# Altium footprint library 3.22-杂项.PcbLib: 199 footprints (part 8 of 15)
Each footprint in its own frame and in the unit in brackets; x right, y up, seen from the top. Pads: shape width x height; smd on the part's side, far side on the other; paste and mask are expansions set on the pad; w line width, h text height; cw(c..) or ccw(c..) is an arc to the next point about the centre after c.
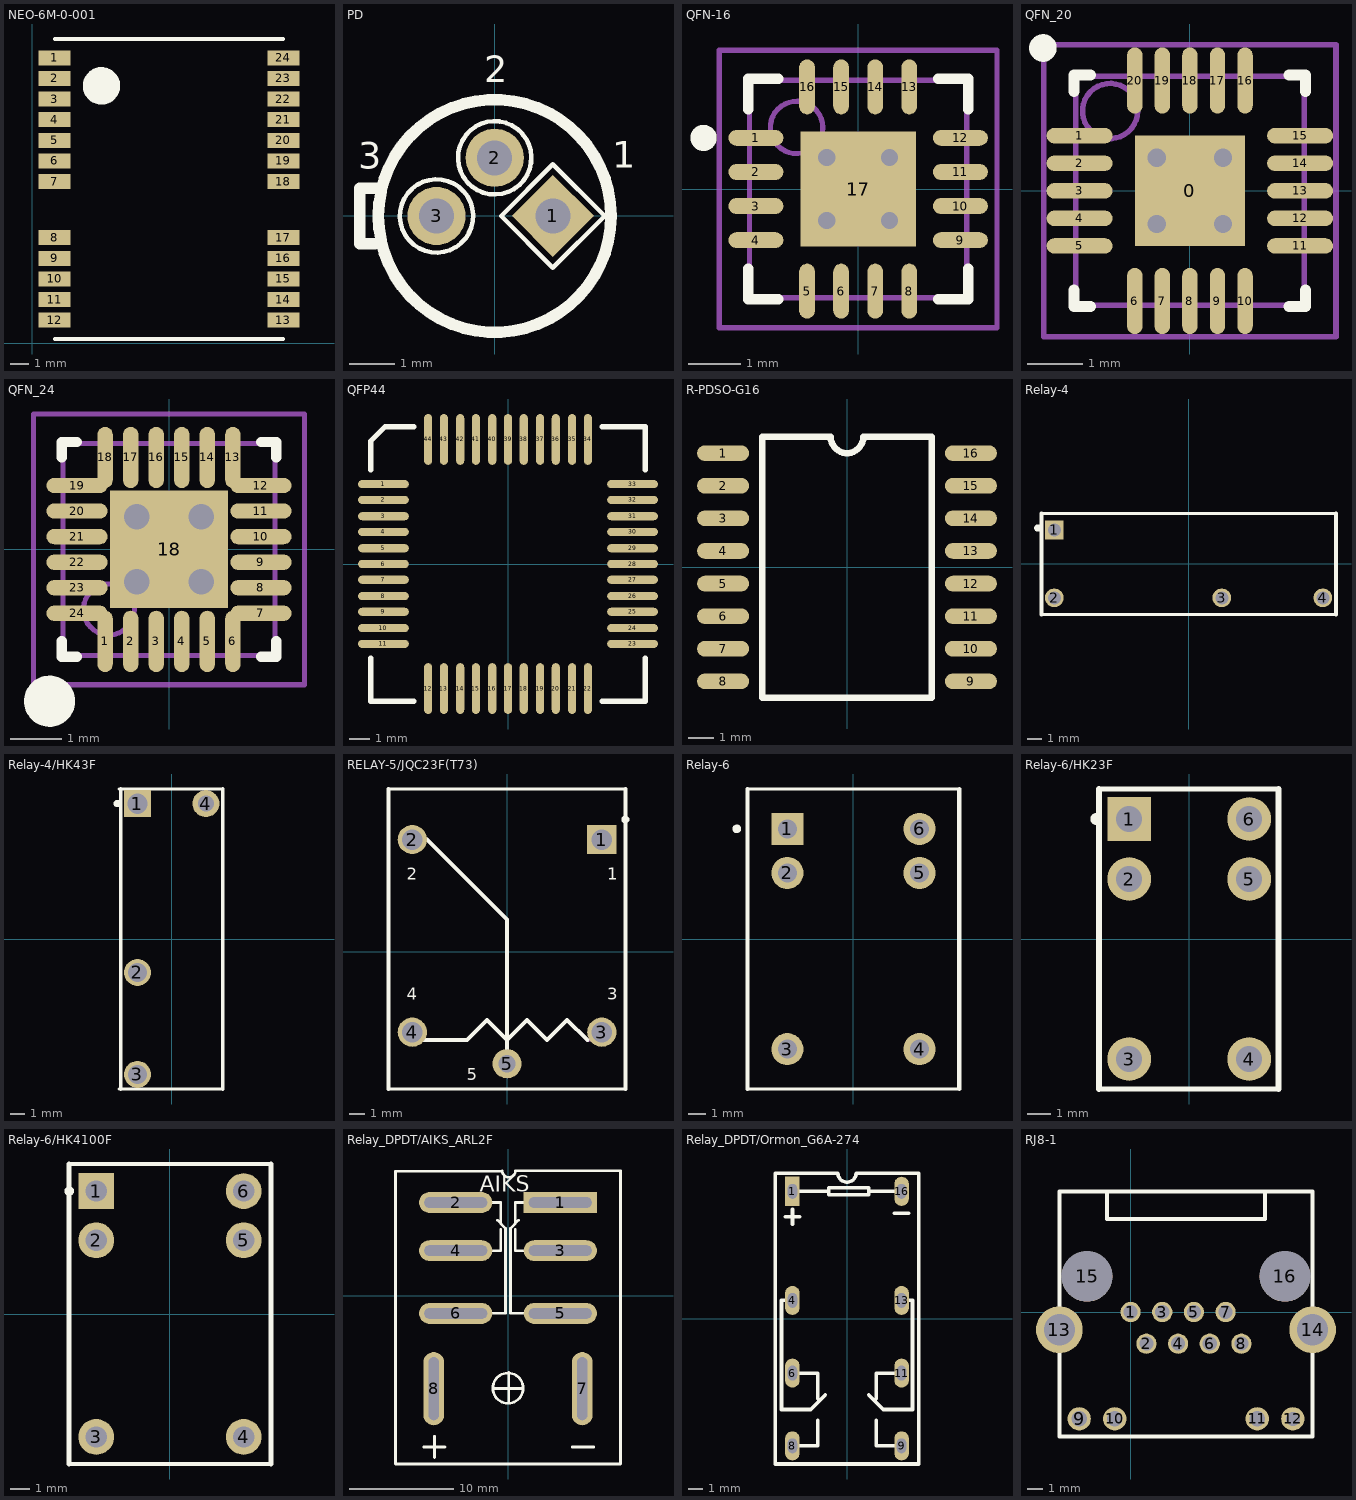
[diagram p7: the footprints below, top view; thin cyan lines are the x and y axes]

## NEO-6M-0-001 [mm] "[ PCBѧϰȺ514746572 ]"
pads (24):
  rect 1.7x0.8 smd: 1(1.199,15.223) 2(1.199,14.123) 3(1.199,13.023) 4(1.199,11.923) 5(1.199,10.823) 6(1.199,9.723) 7(1.199,8.623) 8(1.199,5.623) 9(1.199,4.523) 10(1.199,3.423) 11(1.199,2.323) 12(1.199,1.223) 13(13.399,1.223) 14(13.399,2.323) 15(13.399,3.423) 16(13.399,4.523) 17(13.399,5.623) 18(13.399,8.623) 19(13.399,9.723) 20(13.399,10.823) 21(13.399,11.923) 22(13.399,13.023) 23(13.399,14.123) 24(13.399,15.223)
Top Overlay:
  circle w1: c3.699,13.723 r0.5
  lines w0.2: 1.199,0.223 13.399,0.223 ; 1.199,16.223 13.399,16.223
3D body: height 0.82, standoff 0.01, extent 1.199,0.223 13.399,16.223
3D body: height 2.4, standoff 0.82, extent 2.199,1.223 12.399,15.223

## PD [mil] "[ PCBѧϰȺ514746572 ]"
pads (3):
  rect 50x50 hole 30 rot 45: 1(50,0)
  round 50 hole 30: 2(0,50) 3(-50,0)
Top Overlay:
  circle w10: c0,0 r100
  lines w3.94: -18.5,1 ccw(c-50,0) -18.5,0.98 ; 5.5,0 50,44.5 94.5,0 50,-44.5 5.5,0 ; 31.5,51 ccw(c0,50) 31.5,50.98
  lines w9.84: -103,-24 -116,-24 -116,24 -102,24
  text "1" at 101,33.5 h39.37
  text "2" at -9,107 h39.37
  text "3" at -117.5,33 h39.37
Bottom Overlay:
  lines w3.94: -18.5,1 ccw(c-50,0) -18.5,0.98 ; 5.5,0 50,-44.5 94.5,0 50,44.5 5.5,0 ; 31.5,51 ccw(c0,50) 31.5,50.98

## QFN-16 [mm] "QFN      [ PCBѧϰȺ514746572 ]"
height 0.8
pads (17):
  oval 1.05x0.3 smd: 1(-1.95,0.975) 2(-1.95,0.325) 3(-1.95,-0.325) 4(-1.95,-0.975) 9(1.95,-0.975) 10(1.95,-0.325) 11(1.95,0.325) 12(1.95,0.975)
  oval 0.3x1.05 smd: 5(-0.975,-1.95) 6(-0.325,-1.95) 7(0.325,-1.95) 8(0.975,-1.95) 13(0.975,1.95) 14(0.325,1.95) 15(-0.325,1.95) 16(-0.975,1.95)
  rect 2.2x2.2 smd: 17(0,0)
via 0.6,-0.6 diameter 0.66 hole 0.33
via -0.6,-0.6 diameter 0.66 hole 0.33
via 0.6,0.6 diameter 0.66 hole 0.33
via -0.6,0.6 diameter 0.66 hole 0.33
Top Overlay:
  circle w0.25: c-2.95,0.975 r0.125
  lines w0.2: -2.1,-1.525 -2.1,-2.1 -1.525,-2.1 ; -2.1,1.525 -2.1,2.1 -1.525,2.1 ; 1.525,-2.1 2.1,-2.1 2.1,-1.525 ; 1.525,2.1 2.1,2.1 2.1,1.525
Mechanical 13:
  circle w0.1: c-1.175,1.175 r0.5
  lines w0.1: -2.075,-2.075 2.075,-2.075 2.075,2.075 -2.075,2.075 -2.075,-2.075
Mechanical 15:
  lines w0.1: -0.5,0 0.5,0 ; 0,-0.5 0,0.5 ; -2.65,-2.65 2.65,-2.65 2.65,2.65 -2.65,2.65 -2.65,-2.65
3D body: height 0.8, standoff 0, extent -2.075,-2.075 2.075,2.075

## QFN_20 [mm] "[ PCBѧϰȺ514746572 ]"
pads (21):
  rect 2x2 smd: 0(0,0)
  oval 1.2x0.28 smd: 1(-2,1) 2(-2,0.5) 3(-2,0) 4(-2,-0.5) 5(-2,-1) 11(2,-1) 12(2,-0.5) 13(2,0) 14(2,0.5) 15(2,1)
  oval 0.28x1.2 smd: 6(-1,-2) 7(-0.5,-2) 8(0,-2) 9(0.5,-2) 10(1,-2) 16(1,2) 17(0.5,2) 18(0,2) 19(-0.5,2) 20(-1,2)
via 0.6,0.6 diameter 0.66 hole 0.33
via 0.6,-0.6 diameter 0.66 hole 0.33
via -0.6,0.6 diameter 0.66 hole 0.33
via -0.6,-0.6 diameter 0.66 hole 0.33
Top Overlay:
  circle w0.25: c-2.667,2.591 r0.125
  lines w0.2: -2.1,-1.8 -2.1,-2.1 -1.8,-2.1 ; -2.1,1.8 -2.1,2.1 -1.8,2.1 ; 1.8,-2.1 2.1,-2.1 2.1,-1.8 ; 1.8,2.1 2.1,2.1 2.1,1.8
Mechanical 13:
  circle w0.1: c-1.448,1.448 r0.5
  lines w0.1: -2.075,-2.075 -2.075,2.075 2.075,2.075 2.075,-2.075 -2.075,-2.075
Mechanical 15:
  lines w0.1: -0.5,0 0.5,0 ; 0,-0.5 0,0.5 ; -2.65,-2.65 -2.65,2.65 2.65,2.65 2.65,-2.65 -2.65,-2.65
3D body: height 1, standoff 0, extent -2.075,-2.075 2.075,2.075

## QFN_24 [mm] "[ PCBѧϰȺ514746572 ]"
pads (25):
  oval 0.3x1.2 smd: 1(-1.25,-1.8) 2(-0.75,-1.8) 3(-0.25,-1.8) 4(0.25,-1.8) 5(0.75,-1.8) 6(1.25,-1.8) 13(1.25,1.8) 14(0.75,1.8) 15(0.25,1.8) 16(-0.25,1.8) 17(-0.75,1.8) 18(-1.25,1.8)
  oval 1.2x0.3 smd: 7(1.8,-1.25) 8(1.8,-0.75) 9(1.8,-0.25) 10(1.8,0.25) 11(1.8,0.75) 12(1.8,1.25) 19(-1.8,1.25) 20(-1.8,0.75) 21(-1.8,0.25) 22(-1.8,-0.25) 23(-1.8,-0.75) 24(-1.8,-1.25)
  rect 2.3x2.3 smd: 18(0,0)
via -0.635,0.635 diameter 0.7 hole 0.5
via 0.635,0.635 diameter 0.7 hole 0.5
via 0.635,-0.635 diameter 0.7 hole 0.5
via -0.635,-0.635 diameter 0.7 hole 0.5
Top Overlay:
  circle w0.5: c-2.337,-2.972 r0.25
  lines w0.2: -2.1,-1.8 -2.1,-2.1 -1.8,-2.1 ; -2.1,1.8 -2.1,2.1 -1.8,2.1 ; 1.8,-2.1 2.1,-2.1 2.1,-1.8 ; 1.8,2.1 2.1,2.1 2.1,1.8
Mechanical 13:
  circle w0.1: c-1.175,-1.175 r0.5
  lines w0.1: -2.075,-2.075 -2.075,2.075 2.075,2.075 2.075,-2.075 -2.075,-2.075
Mechanical 15:
  lines w0.1: -0.5,0 0.5,0 ; 0,-0.5 0,0.5 ; -2.65,-2.65 -2.65,2.65 2.65,2.65 2.65,-2.65 -2.65,-2.65
3D body: height 1, standoff 0, extent -2.075,-2.075 2.075,2.075

## QFP44 [mil] "ATmega16L-8AI      [ PCBѧϰȺ514746572 ]"
pads (44):
  oval 100x16 smd: 1(-245,157) 2(-245,126) 3(-245,94) 4(-245,63) 5(-245,31) 6(-245,0) 7(-245,-31) 8(-245,-63) 9(-245,-94) 10(-245,-126) 11(-245,-157) 23(245,-157) 24(245,-126) 25(245,-94) 26(245,-63) 27(245,-31) 28(245,0) 29(245,31) 30(245,63) 31(245,94) 32(245,126) 33(245,157)
  oval 16x100 smd: 12(-157,-245) 13(-126,-245) 14(-94,-245) 15(-63,-245) 16(-31,-245) 17(0,-245) 18(31,-245) 19(63,-245) 20(94,-245) 21(126,-245) 22(157,-245) 34(157,245) 35(126,245) 36(94,245) 37(63,245) 38(31,245) 39(0,245) 40(-31,245) 41(-63,245) 42(-94,245) 43(-126,245) 44(-157,245)
Top Overlay:
  lines w10: -270,-185 -270,-270 -185,-270 ; -270,185 -270,242 -242,270 -185,270 ; 185,-270 270,-270 270,-185 ; 185,270 270,270 270,185

## R-PDSO-G16 [mil] "[ PCBѧϰȺ514746572 ]"
pads (16):
  oval 80x24 smd: 1(-190,175) 2(-190,125) 3(-190,75) 4(-190,25) 5(-190,-25) 6(-190,-75) 7(-190,-125) 8(-190,-175) 9(190,-175) 10(190,-125) 11(190,-75) 12(190,-25) 13(190,25) 14(190,75) 15(190,125) 16(190,175)
Top Overlay:
  lines w10: -130,-200 130,-200 130,200 25,200 cw(c0,200) -25,200 -130,200 -130,-200

## Relay-4 [mm] "HK43F继电器（4脚）      [ PCB学习群514746572 ]"
pads (4):
  rect 1.3x1.3 hole 0.9: 1(-9.3,2.35)
  round 1.3 hole 0.9: 2(-9.3,-2.35) 3(2.3,-2.35) 4(9.3,-2.35)
Top Overlay:
  circle w0.25: c-10.441,2.477 r0.125
  lines w0.2: -10.189,-3.507 10.211,-3.507 ; -10.189,3.493 10.211,3.493
  lines w0.254: -10.189,-3.507 -10.189,3.493 ; 10.211,-3.507 10.211,3.493

## Relay-4/HK43F [mm] "汇科HK43F继电器20.4*7*15      [ PCB学习群514746572 ]"
height 15
pads (4):
  rect 1.85x1.85 hole 1.4: 1(-2.35,9.3)
  round 1.85 hole 1.3: 2(-2.35,-2.3) 3(-2.35,-9.3)
  round 1.85 hole 1.1: 4(2.35,9.3)
Top Overlay:
  circle w0.25: c-3.745,9.3 r0.125
  lines w0.2: -3.62,-10.3 3.5,-10.3 ; -3.62,10.3 3.5,10.3
  lines w0.254: -3.5,-10.3 -3.5,10.3 ; 3.5,-10.3 3.5,10.3

## RELAY-5/JQC23F(T73) [mm] "宁波神乐RELAY-5/JQC23F(T73)继电器（5脚）18*13.4*15.5      [ PCB学习群514746572 ]"
pads (5):
  rect 1.85x1.85 hole 1.3: 1(6,7.1)
  round 1.85 hole 1.3: 2(-6,7.1) 3(6,-5.1) 4(-6,-5.1)
  round 1.85 hole 1.1: 5(0,-7.1)
Top Overlay:
  circle w0.25: c7.495,8.37 r0.125
  lines w0.2: -7.5,-8.7 7.5,-8.7 ; -7.5,10.3 7.5,10.3
  lines w0.254: -7.5,-8.7 -7.5,10.3 ; -6.35,-5.6 -2.54,-5.6 -1.27,-4.33 0,-5.6 1.27,-4.33 2.54,-5.6 3.81,-4.33 5.08,-5.6 ; -5.08,7.1 0,2.02 0,-6.87 ; 7.5,-8.7 7.5,10.3
  text "5" at -2.54,-8.14 h0.76
  text "3" at 6.35,-3.06 h0.76
  text "4" at -6.35,-3.06 h0.76
  text "2" at -6.35,4.56 h0.76
  text "1" at 6.35,4.56 h0.76
Keep-Out Layer:
  lines w0.254: -6.35,7.1 -5.08,7.1 ; 5.08,-5.6 6.35,-5.6

## Relay-6 [mm] "JRC-21F-05VDC继电器（6脚）      [ PCB学习群514746572 ]"
pads (6):
  rect 1.85x1.85 hole 1.1: 1(-3.81,6.35)
  round 1.85 hole 1.1: 2(-3.81,3.81) 3(-3.81,-6.35) 4(3.81,-6.35) 5(3.81,3.81) 6(3.81,6.35)
Top Overlay:
  circle w0.25: c-6.729,6.35 r0.125
  lines w0.2: -6.11,-8.65 6.11,-8.65 ; -6.11,8.65 6.11,8.65
  lines w0.254: -6.11,-8.65 -6.11,8.65 ; 6.11,-8.65 6.11,8.65

## Relay-6/HK23F [mm] "汇科HK23F继电器（6脚）12.5*7.5*10.3      [ PCB学习群514746572 ]"
pads (6):
  rect 1.85x1.85 hole 1.1: 1(-2.54,5.08)
  round 1.85 hole 1.1: 2(-2.54,2.54) 3(-2.54,-5.08) 4(2.54,-5.08) 5(2.54,2.54) 6(2.54,5.08)
Top Overlay:
  circle w0.25: c-3.935,5.08 r0.125
  lines w0.2: -3.81,-6.35 3.79,-6.35 ; -3.81,6.35 3.79,6.35
  lines w0.254: -3.81,-6.35 -3.81,6.35 ; 3.79,-6.35 3.79,6.35

## Relay-6/HK4100F [mm] "汇科HK4100F继电器（6脚）15.5*10.5*11.8      [ PCB学习群514746572 ]"
pads (6):
  rect 1.85x1.85 hole 1.1: 1(-3.81,6.35)
  round 1.85 hole 1.1: 2(-3.81,3.81) 3(-3.81,-6.35) 4(3.81,-6.35) 5(3.81,3.81) 6(3.81,6.35)
Top Overlay:
  circle w0.25: c-5.205,6.35 r0.125
  lines w0.2: -5.22,-7.75 5.23,-7.75 ; -5.22,7.75 5.23,7.75
  lines w0.254: -5.22,-7.75 -5.22,7.75 ; 5.23,-7.75 5.23,7.75

## Relay_DPDT/AIKS_ARL2F [mm] "香港爱克斯AIKSDPDT继电器ARL2F_5VDC_220VAC10A/28VDC10A      [ PCB学习群514746572 ]"
pads (8):
  rect 7x2 hole 1 slot 6 at 0 deg: 1(5,8.9)
  oval 7x2 hole 1 slot 6 at 0 deg: 2(-5,8.9) 3(5,4.3) 4(-5,4.3) 5(5,-1.7) 6(-5,-1.7)
  oval 2x7 hole 1 slot 6 at 90 deg: 7(7.1,-8.9) 8(-7.1,-8.9)
Top Overlay:
  circle w0.254: c0,-8.85 r1.448
  lines w0.254: -8.048,-14.468 -6.016,-14.468 ; -7.032,-15.484 -7.032,-13.452 ; -5,-1.7 -0.242,-1.7 -0.242,6.428 -1.027,7.213 ; -5,4.3 -0.682,4.3 -0.682,6.332 ; -5,8.9 -0.682,8.9 -0.682,6.868 ; -1.444,-8.88 1.418,-8.88 ; -0.555,11.9 -10.75,11.9 -10.75,-16.1 10.75,-16.1 10.75,11.9 ; -0.555,11.948 ccw(c0.08,11.948) 0.715,11.948 10.75,11.948 ; 0.08,-10.15 0.08,-8.88 0.08,-7.356 ; 0.682,6.332 0.682,4.3 5,4.3 ; 0.682,6.868 0.682,8.9 5,8.9 ; 1.027,7.213 0.242,6.428 0.242,-1.7 5,-1.7 ; 6.152,-14.468 8.184,-14.468
  text "AIKS" at -2.714,9.916 h1.52

## Relay_DPDT/Ormon_G6A-274 [mil] "欧姆龙DPDT继电器DIP16封装改成8脚      [ PCB学习群514746572 ]"
pads (8):
  rect 40x80 hole 25 slot 40 at 90 deg: 1(-150,350)
  oval 40x80 hole 25 slot 40 at 90 deg: 4(-150,50) 6(-150,-150) 8(-150,-350) 9(150,-350) 11(150,-150) 13(150,50) 16(150,350)
Top Overlay:
  lines w10: -170,280 -160,280 -140,280 -130,280 ; -150,-350 -80,-350 -80,-280 ; -150,-150 -80,-150 -80,-220 ; -150,50 -180,50 -180,-250 -100,-250 -60,-210 ; -150,260 -150,300 ; -150,350 -50,350 ; -30,340 60,340 ; 60,-210 100,-250 180,-250 180,50 150,50 ; 60,350 150,350 ; 80,-280 80,-350 150,-350 ; 80,-220 80,-150 150,-150 ; 130,290 170,290 ; 60,340 -50,340 -50,360 60,360 60,340 ; -197.24,-400 -197.24,400 -25,400 ccw(c0,400) 25,400 197.24,400 197.24,-400 -197.24,-400

## RJ8-1 [mm] "网络      [ PCB学习群514746572 ]"
pads (16):
  round 1.3 hole 0.9: 1(0,0) 2(1.016,-2.032) 3(2.032,0) 4(3.048,-2.032) 5(4.064,0) 6(5.08,-2.032) 7(6.096,0) 8(7.112,-2.032)
  round 1.5 hole 1: 9(-3.302,-6.858) 10(-1.016,-6.858) 11(8.128,-6.858)
  round 1.5 hole 0.9: 12(10.414,-6.858)
  round 3 hole 2: 13(-4.572,-1.143) 14(11.684,-1.143)
  round 3.251 hole 3.251: 15(-2.794,2.286) 16(9.906,2.286)
Top Overlay:
  lines w0.254: -1.524,7.747 -1.524,5.969 8.636,5.969 8.636,7.747 ; -4.572,-8.001 -4.572,-1.143 -4.572,7.747 11.684,7.747 11.684,-1.143 11.684,-8.001 -4.572,-8.001